# Altium footprint library MyPcbLib.PcbLib: 65 footprints (part 2 of 5)
Each footprint in its own frame and in the unit in brackets; x right, y up, seen from the top. Pads: shape width x height; smd on the part's side, far side on the other; paste and mask are expansions set on the pad; w line width, h text height; cw(c..) or ccw(c..) is an arc to the next point about the centre after c.
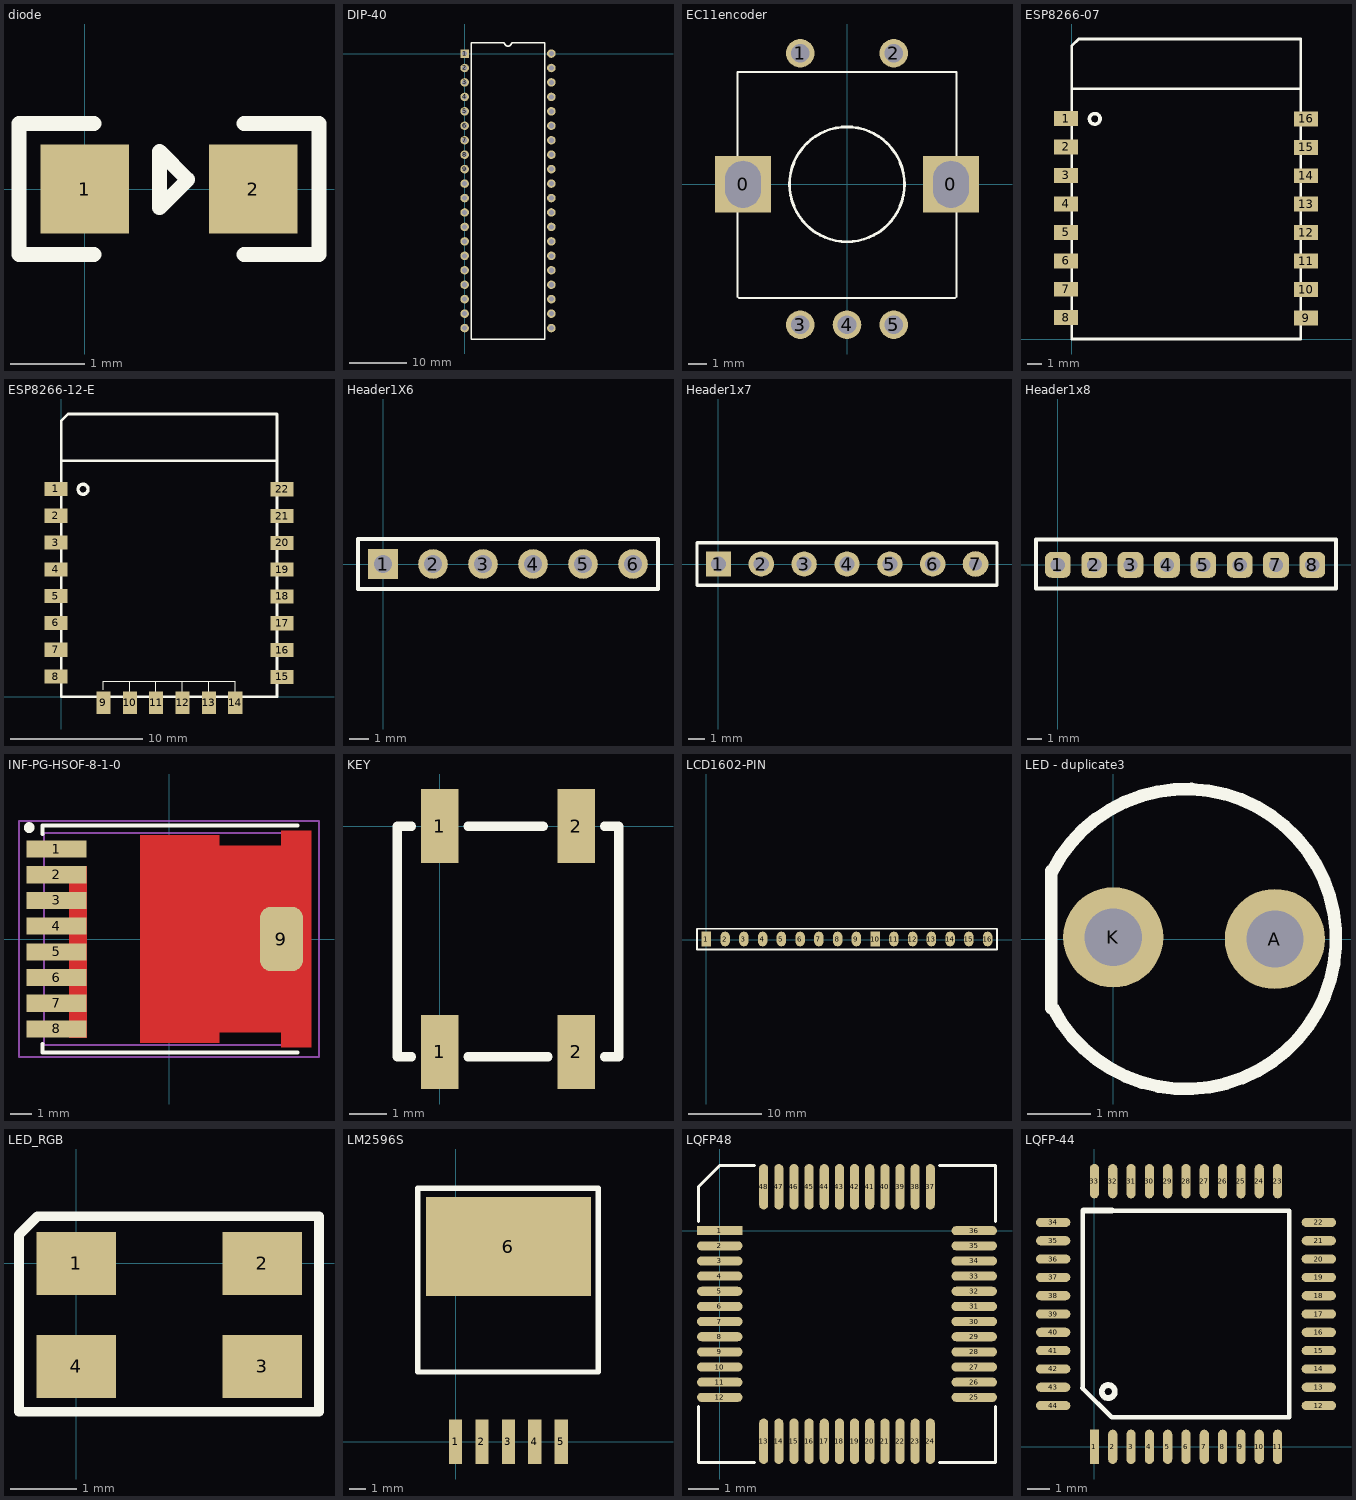
[diagram p1: the footprints below, top view; thin cyan lines are the x and y axes]

## diode [mm]
pads (2):
  rect 1.2x1.2 smd: 1(0,0) 2(2.286,0)
Top Overlay:
  lines w0.2: 0.127,-0.889 -0.889,-0.889 -0.889,0.889 0.127,0.889 ; 2.159,-0.889 3.175,-0.889 3.175,0.889 2.159,0.889 ; 1.016,-0.254 1.016,0.508 1.397,0.127 1.016,-0.254

## DIP-40 [mm]
pads (40):
  rect 1.5x1.5 hole 0.9: 1(0,0)
  round 1.5 hole 0.9: 2(0,-2.54) 3(0,-5.08) 4(0,-7.62) 5(0,-10.16) 6(0,-12.7) 7(0,-15.24) 8(0,-17.78) 9(0,-20.32) 10(0,-22.86) 11(0,-25.4) 12(0,-27.94) 13(0,-30.48) 14(0,-33.02) 15(0,-35.56) 16(0,-38.1) 17(0,-40.64) 18(0,-43.18) 19(0,-45.72) 20(0,-48.26) 21(15.24,-48.26) 22(15.24,-45.72) 23(15.24,-43.18) 24(15.24,-40.64) 25(15.24,-38.1) 26(15.24,-35.56) 27(15.24,-33.02) 28(15.24,-30.48) 29(15.24,-27.94) 30(15.24,-25.4) 31(15.24,-22.86) 32(15.24,-20.32) 33(15.24,-17.78) 34(15.24,-15.24) 35(15.24,-12.7) 36(15.24,-10.16) 37(15.24,-7.62) 38(15.24,-5.08) 39(15.24,-2.54) 40(15.24,0)
Top Overlay:
  lines w0.25: 1.17,-50.18 1.17,1.92 6.985,1.92 ccw(c7.62,1.92) 8.255,1.92 14.07,1.92 14.07,-50.18 1.17,-50.18

## EC11encoder [mm] "编码电位器"
pads (7):
  rect 3x3 hole 1.9 slot 2.5 at 90 deg: 0(-5.55,0) 0(5.55,0)
  round 1.524 hole 1: 1(-2.5,7) 2(2.5,7) 3(-2.5,-7.5) 4(0,-7.5) 5(2.5,-7.5)
Top Overlay:
  circle w0.15: c0,0 r3.069
  lines w0.1: -5.85,6 -5.85,-6 -5.779,-6.071 5.779,-6.071 5.85,-6 5.85,6 ; -5.842,5.994 5.85,5.994

## ESP8266-07 [mil] "WiFi module"
pads (16):
  rect 67.87x42.13 smd: 1(-16,621) 2(-16,540.86) 3(-16,460.71) 4(-16,380.57) 5(-16,300.43) 6(-16,220.29) 7(-16,140.14) 8(-16,60) 9(660,59.14) 10(660,139.29) 11(660,219.43) 12(660,299.57) 13(660,379.71) 14(660,459.86) 15(660,540) 16(660,620.14)
Top Overlay:
  circle w10: c65,620 r15
  lines w7.87: 0,705 645,705 ; 0,0 0,825 20,845 645,845 645,0 0,0
Top Paste:
  text "ANT" at 200,730 h145.67

## ESP8266-12-E [mil] "WiFi module"
height 102.36
pads (22):
  rect 67.87x42.13 smd: 1(-16,621) 2(-16,540.86) 3(-16,460.71) 4(-16,380.57) 5(-16,300.43) 6(-16,220.29) 7(-16,140.14) 8(-16,60) 15(660,59.14) 16(660,139.29) 17(660,219.43) 18(660,299.57) 19(660,379.71) 20(660,459.86) 21(660,540) 22(660,620.14)
  rect 42.13x67.87 smd: 9(126,-18) 10(204.8,-18) 11(283.6,-18) 12(362.4,-18) 13(441.2,-18) 14(520,-18)
Top Overlay:
  circle w10: c65,620 r15
  lines w2.13: 125,20 125,46 204,46 ; 204,11 204,46 ; 283,12 283,46 ; 362,12 362,46 ; 441,9 441,46 ; 520,11 520,46 441,46 ; 204,46 283,46 ; 283,46 362,46 ; 362,46 441,46
  lines w7.87: 0,705 645,705 ; 0,0 0,825 20,845 645,845 645,0 0,0
Top Paste:
  text "ANT" at 200,730 h145.67

## Header1X6 [mm]
pads (6):
  rect 1.5x1.5 hole 0.9: 1(0,0)
  round 1.5 hole 0.9: 2(2.54,0) 3(5.08,0) 4(7.62,0) 5(10.16,0) 6(12.7,0)
Top Overlay:
  lines w0.2: -1.27,-1.27 -1.27,1.27 13.97,1.27 13.97,-1.27 -1.27,-1.27

## Header1x7 [mm]
pads (7):
  rect 1.5x1.5 hole 0.9: 1(0,0)
  round 1.5 hole 0.9: 2(2.54,0) 3(5.08,0) 4(7.62,0) 5(10.16,0) 6(12.7,0)
  round 1.524 hole 0.762: 7(15.24,0)
Top Overlay:
  lines w0.2: -1.27,-1.27 16.51,-1.27 16.51,1.27 -1.27,1.27 -1.27,-1.27

## Header1x8 [mm]
pads (8):
  rrect50% 1.8x1.8 hole 1: 1(0,0) 2(2.54,0) 3(5.08,0) 4(7.62,0) 5(10.16,0) 6(12.7,0) 7(15.24,0) 8(17.78,0)
Top Overlay:
  lines w0.254: -1.524,-1.651 -1.524,1.778 19.431,1.778 19.431,-1.651 -1.524,-1.651

## INF-PG-HSOF-8-1-0 [mm] "PG-HSOF-8-1"
height 2.4
pads (9):
  rect 2.8x0.8 smd paste+0 mask+0: 1(-5.25,4.2) 2(-5.25,3) 3(-5.25,1.8) 4(-5.25,0.6) 5(-5.25,-0.6) 6(-5.25,-1.8) 7(-5.25,-3) 8(-5.25,-4.2)
  rrect50% 2x3 smd paste+0 mask+0: 9(5.25,0)
Top Layer:
  region: -3.85,3.4 -3.85,-4.6 -4.65,-4.6 -4.65,3.4
  region: 6.65,5.05 6.65,-5.05 5.25,-5.05 5.25,-4.35 2.35,-4.35 2.35,-4.85 -1.35,-4.85 -1.35,4.85 2.35,4.85 2.35,4.35 5.25,4.35 5.25,5.05
Top Overlay:
  circle w0.25: c-6.525,5.2 r0.125
  lines w0.2: -5.9,-4.9 -5.9,-5.3 6,-5.3 ; -5.9,4.9 -5.9,5.3 6,5.3
Mechanical 3:
  text ".DESIGNATOR" at 0,0 h1.2
Mechanical 13:
  lines w0.1: -5.84,-4.95 5.84,-4.95 5.84,4.95 -5.84,4.95 -5.84,-4.95
Mechanical 15:
  lines w0.1: -0.5,0 0.5,0 ; 0,-0.5 0,0.5 ; -7,-5.5 7,-5.5 7,5.5 -7,5.5 -7,-5.5
3D body "PG-HSOF-8-1.stp": height 2.31, standoff 0, extent -5.837,-4.95 5.838,4.95
3D body: height 0.5, standoff 0, extent -5.8,-4.6 -3.861,3.4
3D body: height 0.5, standoff 0, extent -5.8,3.8 -3.861,4.6
3D body: height 0.5, standoff 0, extent -0.85,-4.9 5.9,4.9
3D body: height 2.4, standoff 2.4, extent -4.77,3.916 -4.171,4.514

## KEY [mm]
pads (4):
  rect 1x2 smd: 1(0,-6.096) 1(0,0) 2(3.683,-6.096) 2(3.683,0)
Top Overlay:
  lines w0.254: -0.762,-6.223 -1.143,-6.223 -1.143,0 -0.762,0 ; 0.762,-6.223 2.921,-6.223 ; 0.762,0 2.794,0 ; 4.445,-6.223 4.826,-6.223 4.826,0 4.445,0

## LCD1602-PIN [mm]
pads (16):
  rect 1.27x2 smd: 1(0,0.127) 10(22.86,0.127)
  oval 1.27x2 smd: 2(2.54,0.127) 3(5.08,0.127) 4(7.62,0.127) 5(10.16,0.127) 6(12.7,0.127) 7(15.24,0.127) 8(17.78,0.127) 9(20.32,0.127) 11(25.4,0.127) 12(27.94,0.127) 13(30.48,0.127) 14(33.02,0.127) 15(35.56,0.127) 16(38.1,0.127)
Top Overlay:
  lines w0.254: -1.27,-1.27 39.37,-1.27 39.37,1.524 -1.27,1.524 -1.27,-1.27

## LED - duplicate3 [mil]
pads (2):
  round 62 hole 35.43: A(100,0) K(0,1)
Top Overlay:
  lines w7.87: -38.34,-42.75 -38.34,42.08 ; -37.62,42.22 cw(c45,0) -37.34,-42.75

## LED_RGB [mm]
pads (4):
  rect 1.2x0.95 smd: 1(0,0) 2(2.8,0) 3(2.8,-1.55) 4(0,-1.55)
Top Overlay:
  lines w0.15: -0.864,-2.235 -0.864,0.432 -0.584,0.711 3.658,0.711 3.658,-2.235 -0.864,-2.235

## LM2596S [mm]
pads (6):
  rect 0.8x2.7 smd: 1(0,0) 2(1.6,0) 3(3.2,0) 4(4.8,0) 5(6.4,0)
  rect 10x6 smd: 6(3.2,11.8)
Top Overlay:
  lines w0.305: -2.286,4.208 8.636,4.208 8.636,15.333 -2.286,15.333 -2.286,4.208

## LQFP48 [mm]
pads (48):
  rect 1.5x0.3 smd: 1(0,0)
  oval 1.5x0.3 smd: 2(0,-0.5) 3(0,-1) 4(0,-1.5) 5(0,-2) 6(0,-2.5) 7(0,-3) 8(0,-3.5) 9(0,-4) 10(0,-4.5) 11(0,-5) 12(0,-5.5) 25(8.4,-5.5) 26(8.4,-5) 27(8.4,-4.5) 28(8.4,-4) 29(8.4,-3.5) 30(8.4,-3) 31(8.4,-2.5) 32(8.4,-2) 33(8.4,-1.5) 34(8.4,-1) 35(8.4,-0.5) 36(8.4,0)
  oval 0.3x1.5 smd: 13(1.45,-6.95) 14(1.95,-6.95) 15(2.45,-6.95) 16(2.95,-6.95) 17(3.45,-6.95) 18(3.95,-6.95) 19(4.45,-6.95) 20(4.95,-6.95) 21(5.45,-6.95) 22(5.95,-6.95) 23(6.45,-6.95) 24(6.95,-6.95) 37(6.95,1.45) 38(6.45,1.45) 39(5.95,1.45) 40(5.45,1.45) 41(4.95,1.45) 42(4.45,1.45) 43(3.95,1.45) 44(3.45,1.45) 45(2.95,1.45) 46(2.45,1.45) 47(1.95,1.45) 48(1.45,1.45)
Top Overlay:
  lines w0.1: -0.7,-5.8 -0.7,-7.65 1.15,-7.65 ; -0.7,0.3 -0.7,1.45 0,2.15 1.15,2.15 ; 7.25,-7.65 9.1,-7.65 9.1,-5.8 ; 7.25,2.15 9.1,2.15 9.1,0.3

## LQFP-44 [mm]
pads (44):
  rect 0.4x1.5 smd: 1(0,0)
  oval 0.4x1.5 smd: 2(0.8,0) 3(1.6,0) 4(2.4,0) 5(3.2,0) 6(4,0) 7(4.8,0) 8(5.6,0) 9(6.4,0) 10(7.2,0) 11(8,0) 23(8,11.6) 24(7.2,11.6) 25(6.4,11.6) 26(5.6,11.6) 27(4.8,11.6) 28(4,11.6) 29(3.2,11.6) 30(2.4,11.6) 31(1.6,11.6) 32(0.8,11.6) 33(0,11.6)
  oval 1.5x0.4 smd: 12(9.8,1.8) 13(9.8,2.6) 14(9.8,3.4) 15(9.8,4.2) 16(9.8,5) 17(9.8,5.8) 18(9.8,6.6) 19(9.8,7.4) 20(9.8,8.2) 21(9.8,9) 22(9.8,9.8) 34(-1.8,9.8) 35(-1.8,9) 36(-1.8,8.2) 37(-1.8,7.4) 38(-1.8,6.6) 39(-1.8,5.8) 40(-1.8,5) 41(-1.8,4.2) 42(-1.8,3.4) 43(-1.8,2.6) 44(-1.8,1.8)
Top Overlay:
  circle w0.254: c0.605,2.413 r0.284
  lines w0.2: -0.523,2.57 0.762,1.285 8.515,1.285 8.515,10.315 0.77,10.315 ; -0.508,2.54 -0.508,10.285
  lines w0.254: -0.478,10.315 0.77,10.315